# Altium schematic symbol library Electronic Devices_LIB.SchLib: 703 symbols (part 2 of 8) (continued)
## CRYSTAL_ABM3-16.000MHZ
designator Y?, comment Frequency: 16MHz  (hidden comment: ABM3-16.000MHZ-D2Y-T)
Crystal 16MHz ±20ppm (Tol) ±30ppm (Stability) 18pF FUND 40Ohm 2-Pin Mini-CSMD T/R; Manufacturer: Abracon; ESR (Equivalent Series Resistance): 40R; Manufacturer Part Number: ABM3-16.000MHZ-D2Y-T; RoHS: Yes; Category: Crystals; Stock 1: 95144; Pricing 1: 1=0.58000, 10=0.48600, 50=0.43720, 100=0.38850, 500=0.36912 (USD); Mount: Surface Mount; Case/Package: SMD/SMT; Number of Pins: 2; Min Operating Temperature: -40°C; Max Operating Temperature: 85°C; Packaging: Tape and Reel; Tolerance: 20ppm; Package Quantity: 1000; Frequency Tolerance: 20ppm; Load Capacitance: 18pF; Frequency Stability: 30ppm; Termination: SMD/SMT; Resistor Type: Ceramic; Series: ABM3; Series Resistance: 40R; Operating Frequency: 16 MHz; Length: 5mm; Width: 3.2mm; Height: 1.3mm; Lead Free: Lead Free; RoHS Compliant: Yes; ComponentLink1URL: https://datasheet.ciiva.com/855/abm3-855934.pdf?src-supplier=Digi-Key; ComponentLink1Description: https://datasheet.ciiva.com/855/abm3-855934.pdf?src-supplier=Digi-Key; ComponentLink2URL: https://datasheet.ciiva.com/855/abm3-855935.pdf?src-supplier=Digi-Key; ComponentLink2Description: https://datasheet.ciiva.com/855/abm3-855935.pdf?src-supplier=Digi-Key; ComponentLink3URL: https://datasheet.ciiva.com/855/abm3-855936.pdf?src-supplier=Digi-Key; ComponentLink3Description: https://datasheet.ciiva.com/855/abm3-855936.pdf?src-supplier=Digi-Key; ComponentLink4URL: https://datasheet.ciiva.com/4945/abm3-47699-4945397.pdf?src-supplier=Mouser; ComponentLink4Description: https://datasheet.ciiva.com/4945/abm3-47699-4945397.pdf?src-supplier=Mouser; ComponentLink5URL: https://datasheet.ciiva.com/7998/abm3-7998565.pdf?src-supplier=Element14; ComponentLink5Description: https://datasheet.ciiva.com/7998/abm3-7998565.pdf?src-supplier=Element14; ComponentLink6URL: https://datasheet.ciiva.com/28508/1754353-28508494.pdf?src-supplier=Element14; ComponentLink6Description: https://datasheet.ciiva.com/28508/1754353-28508494.pdf?src-supplier=Element14; ComponentLink7URL: https://datasheet.ciiva.com/16223/abm3-16223365.pdf?src-supplier=Future+Electronics; ComponentLink7Description: https://datasheet.ciiva.com/16223/abm3-16223365.pdf?src-supplier=Future+Electronics; Supplier 1: Digi-Key; Supplier 2: Newark; Supplier 3: Avnet; Supplier Part Number 1: 535-10638-1-ND; Supplier Part Number 2: 40Y1986; Supplier Part Number 3: 77R1470
footprint CRYSTAL_ABM3-16.000MHZ-D2Y-T
pins: 1 OSC1, 2 OSC2

## CRYSTAL_ABRACON_32.768KHZ
designator Y?, comment Frequency: 32.768KHz  (hidden comment: ASH7KW-32.768kHz-L-T)
OSC XO 32.768KHZ CMOS SMD; Manufacturer: Abracon; Supplier 1: Digi-Key; Manufacturer Part Number: ASH7KW-32.768kHz-L-T; RoHS: Yes; Category: Oscillators; Stock 1: 174; Pricing 1: 1=2.4, 10=2.343, 50=2.231, 100=1.9521, 500=1.89636 (USD); ComponentLink1URL: https://datasheet.ciiva.com/15010/ash7kw-15010563.pdf?src-supplier=Digi-Key; ComponentLink1Description: https://datasheet.ciiva.com/15010/ash7kw-15010563.pdf?src-supplier=Digi-Key; ComponentLink2URL: https://datasheet.ciiva.com/30037/ash7kw-30037881.pdf?src-supplier=Avnet; ComponentLink2Description: https://datasheet.ciiva.com/30037/ash7kw-30037881.pdf?src-supplier=Avnet; ComponentLink3URL: https://datasheet.ciiva.com/15010/ash7kw-15010565.pdf?src-supplier=Digi-Key; ComponentLink3Description: https://datasheet.ciiva.com/15010/ash7kw-15010565.pdf?src-supplier=Digi-Key; Supplier Part Number 1: 535-12059-1-ND
footprint CRYSTAL_32.768KHZ_ASH7KW32768kHzLT (0.126" L x 0.059" W (3.20mm x 1.50mm))
pins: 1 OUTPUT, 2 GND, 3 OE, 4 VDD

## CRYSTAL_ABRACON_32.768KHz_ABS07-32.768KHZ-T
designator Y?, comment Operating Frequency: 32.768 KHz  (hidden comment: ABS07-32.768KHZ-T)
Crystal 0.032768MHz ±20ppm (Tol) 12.5pF Flexural 70000Ohm 2-Pin CSMD T/R; Manufacturer: Abracon; ESR (Equivalent Series Resistance): 70kR; Supplier 1: Digikey; Manufacturer Part Number: ABS07-32.768KHZ-T; RoHS: Yes; Category: Crystals; Stock 1: 1583168; Pricing 1: 1=0.69, 10=0.576, 50=0.5184, 100=0.4607, 500=0.43768, 1000=0.36858 (USD); Case/Package: CSMD; Number of Pins: 2; Min Operating Temperature: -40°C; Max Operating Temperature: 85°C; Frequency Tolerance: 20ppm; Load Capacitance: 12.5pF; Frequency: 32.768kHz; Packaging: Tape and Reel; Series: ABS07; Package Quantity: 3000; Tolerance: 20ppm; Termination: SMD/SMT; Series Resistance: 70kR; Length: 3.2mm; Width: 1.5mm; Height: 0.9mm; Depth: 1.5mm; Radiation Hardening: No; RoHS Compliant: Yes; Lead Free: Lead Free; Reach SVHC Compliant: No; ComponentLink1URL: https://datasheet.ciiva.com/7998/1912628-7998667.pdf?src-supplier=Element14; ComponentLink1Description: https://datasheet.ciiva.com/7998/1912628-7998667.pdf?src-supplier=Element14; ComponentLink2URL: https://datasheet.ciiva.com/1357/1883680-1357319.pdf?src-supplier=Element14; ComponentLink2Description: https://datasheet.ciiva.com/1357/1883680-1357319.pdf?src-supplier=Element14; ComponentLink3URL: https://datasheet.ciiva.com/854/abs07-854936.pdf?src-supplier=Digikey; ComponentLink3Description: https://datasheet.ciiva.com/854/abs07-854936.pdf?src-supplier=Digikey; ComponentLink4URL: https://datasheet.ciiva.com/854/abs07-854935.pdf?src-supplier=Digikey; ComponentLink4Description: https://datasheet.ciiva.com/854/abs07-854935.pdf?src-supplier=Digikey; ComponentLink5URL: https://datasheet.ciiva.com/854/abs07-854937.pdf?src-supplier=Digikey; ComponentLink5Description: https://datasheet.ciiva.com/854/abs07-854937.pdf?src-supplier=Digikey; ComponentLink6URL: https://datasheet.ciiva.com/4944/abs07-11028-4944830.pdf?src-supplier=Mouser; ComponentLink6Description: https://datasheet.ciiva.com/4944/abs07-11028-4944830.pdf?src-supplier=Mouser; Supplier Part Number 1: 535-9542-1-ND
footprint CRYSTAL_ABS07-32.768KHZ-T (0.126" L x 0.059" W (3.20mm x 1.50mm))
pins: 1 OSC1, 2 OSC2

## CRYSTAL_ABRACON_50MHz_ASDMB-50.000MHZ-LC-T
designator Y?, comment ASDMB-50.000MHZ-LC-T
Oscillator MEMS 50MHz ±50ppm (Stability) 15pF LVCMOS 55% 1.8V/2.5V/3.3V Automotive 4-Pin QFN SMD T/R; Manufacturer: Abracon; Operating Supply Voltage: 3.3V; Max Supply Voltage: 4V; Min Supply Voltage: -300mV; Max Supply Current: 16mA; Supplier 1: Digikey; Manufacturer Part Number: ASDMB-50.000MHZ-LC-T; RoHS: Yes; Category: Oscillators; Stock 1: 1587; Pricing 1: 1=2.76, 10=2.134, 50=2.0774, 100=2.0507, 500=1.5675 (USD); Mount: Surface Mount; Case/Package: SMD/SMT; Number of Pins: 4; Min Operating Temperature: -40°C; Max Operating Temperature: 85°C; Frequency: 50MHz; Load Capacitance: 15pF; Packaging: Tape and Reel; Frequency Stability: 50ppm; Termination: SMD/SMT; Series: ASDMB, Pure Silicon™; Operating Frequency: 50 MHz; Reach SVHC Compliant: No; Lead Free: Lead Free; RoHS Compliant: Yes; ComponentLink1URL: https://datasheet.ciiva.com/871/asdmb-871369.pdf?src-supplier=Digikey; ComponentLink1Description: https://datasheet.ciiva.com/871/asdmb-871369.pdf?src-supplier=Digikey; ComponentLink2URL: https://datasheet.ciiva.com/871/asdmb-871370.pdf?src-supplier=Digikey; ComponentLink2Description: https://datasheet.ciiva.com/871/asdmb-871370.pdf?src-supplier=Digikey; ComponentLink3URL: https://datasheet.ciiva.com/871/asdmb-871371.pdf?src-supplier=Digikey; ComponentLink3Description: https://datasheet.ciiva.com/871/asdmb-871371.pdf?src-supplier=Digikey; ComponentLink4URL: https://datasheet.ciiva.com/48464/asdmb-48464511.pdf?src-supplier=Avnet; ComponentLink4Description: https://datasheet.ciiva.com/48464/asdmb-48464511.pdf?src-supplier=Avnet; Supplier Part Number 1: 535-11738-1-ND
footprint XTAL_ASDMB-50.000MHZ-LC-T
pins: 1 STANDBY, 2 GND (power), 3 OUTPUT, 4 VDD (power)

## CRYSTAL_ABS_32KHZ
designator Y?, comment Frequency: 32kHz  (hidden comment: ABS25-32.000KHZ-T)
Crystal 32.0000Khz 12.5Pf Smd/Tape & Reel (Tr) Rohs Compliant: Yes |Abracon ABS25-32.000KHZ-T; ESR (Equivalent Series Resistance): 50kR; Frequency Tolerance: 30ppm; Supplier 1: Digi-Key; Manufacturer: Abracon; Manufacturer Part Number: ABS25-32.000KHZ-T; RoHS: Yes; Category: Crystals; Stock 1: 595; Pricing 1: 1=1.84, 10=1.762, 50=1.721, 100=1.4751, 500=1.43414, 1000=1.20877 (USD); Mount: Surface Mount; Case/Package: SMD/SMT; Min Operating Temperature: -40°C; Max Operating Temperature: 85°C; Load Capacitance: 12.5pF; Packaging: Tape and Reel; Package Quantity: 3000; Series Resistance: 50kR; Tolerance: 30ppm; Termination: SMD/SMT; Series: ABS25; Length: 8mm; Width: 3.8mm; Height: 2.5mm; Depth: 3.8mm; RoHS Compliant: Yes; ComponentLink1URL: https://datasheet.ciiva.com/15116/getdatasheetpartid-723819-15116856.pdf?src-supplier=Verical; ComponentLink1Description: https://datasheet.ciiva.com/15116/getdatasheetpartid-723819-15116856.pdf?src-supplier=Verical; ComponentLink2URL: https://datasheet.ciiva.com/856/abs25-856061.pdf?src-supplier=Digi-Key; ComponentLink2Description: https://datasheet.ciiva.com/856/abs25-856061.pdf?src-supplier=Digi-Key; ComponentLink3URL: https://datasheet.ciiva.com/856/abs25-856062.pdf?src-supplier=Digi-Key; ComponentLink3Description: https://datasheet.ciiva.com/856/abs25-856062.pdf?src-supplier=Digi-Key; ComponentLink4URL: https://datasheet.ciiva.com/856/abs25-856063.pdf?src-supplier=Digi-Key; ComponentLink4Description: https://datasheet.ciiva.com/856/abs25-856063.pdf?src-supplier=Digi-Key; Supplier Part Number 1: 535-10242-1-ND
footprint CRYSTAL_ABS2532000KHZT (0.315" L x 0.150" W (8.00mm x 3.80mm))
pins: 1 XTAL_1, 2 GND_1, 3 GND_2, 4 XTAL_2

## CRYSTAL_DIODES_27MHZ_NX5427001Z
designator Y?, comment NX5427001Z  Frequency: 27MHz
Crystal Clock Oscillator 27MHz ±25ppm 3.3V 6-Pin SMD T/R; Manufacturer: Diodes; Supplier 1: Digi-Key; Manufacturer Part Number: NX5427001Z; RoHS: Yes; Category: Oscillators; Stock 1: 5550; Pricing 1: 1=4.2, 10=4, 50=3.7996, 100=3.3997 (USD); Supplier Part Number 1: NX5427001ZDICT-ND
footprint CRYSTAL_27MHz_NX5427001Z (0.197" L x 0.126" W (5.00mm x 3.20mm))
pins: 1 OE, 2 NC, 3 GROUND, 4 Q, 5 ~{Q}, 6 VCC

## CRYSTAL_ECS_24MHZ
designator Y?, comment Frequency: 24MHz  (hidden comment: ECS-240-18-23A-EN-TR)
Crystal 24MHz ±30ppm (Tol) ±50ppm (Stability) 18pF FUND 30Ohm 2-Pin Mini-SMD T/R; Manufacturer: ECS International; ESR (Equivalent Series Resistance): 40R; Manufacturer Part Number: ECS-240-18-23A-EN-TR; RoHS: Yes; Category: Crystals; Stock 1: 32996; Pricing 1: 1=1.14000, 10=1.08600, 50=1.06040, 100=0.90900, 500=0.88376 (USD); Mount: Surface Mount; Case/Package: SMD/SMT; Min Operating Temperature: -40°C; Max Operating Temperature: 85°C; Package Quantity: 1; Load Capacitance: 18pF; Packaging: Tape and Reel; Frequency Tolerance: 30ppm; Frequency Stability: 50ppm; Termination: SMD/SMT; Series: ECX-64A; Length: 0.236inch; Width: 0.138inch; Height: 0.043inch; ComponentLink1URL: https://datasheet.ciiva.com/860/ecx-64a-ecx-64cr-860829.pdf?src-supplier=Digi-Key; ComponentLink1Description: https://datasheet.ciiva.com/860/ecx-64a-ecx-64cr-860829.pdf?src-supplier=Digi-Key; ComponentLink2URL: https://datasheet.ciiva.com/860/ecx-64a-ecx-64cr-860830.pdf?src-supplier=Digi-Key; ComponentLink2Description: https://datasheet.ciiva.com/860/ecx-64a-ecx-64cr-860830.pdf?src-supplier=Digi-Key; ComponentLink3URL: https://datasheet.ciiva.com/860/ecx-64a-ecx-64cr-860831.pdf?src-supplier=Digi-Key; ComponentLink3Description: https://datasheet.ciiva.com/860/ecx-64a-ecx-64cr-860831.pdf?src-supplier=Digi-Key; Supplier 1: Digi-Key; Supplier 2: Mouser; Supplier 3: Avnet; Supplier Part Number 1: XC1669CT-ND; Supplier Part Number 2: 520-240-18-23A-EN; Supplier Part Number 3: ECS-240-18-23A-EN-TR
footprint CRYSTAL_ECS-240-18-23A-EN-TR
pins: 1 OSC1, 2 OSC2

## CRYSTAL_ECS_25MHZ_ECS-250-18-33-JTM-TR
designator Y?, comment ECS-250-18-33-JTM-TR  Frequency: 25MHz
Crystal 25MHz ±20ppm (Tol) ±20ppm (Stability) 18pF FUND 40Ohm 4-Pin Mini-CSMD T/R; Manufacturer: ECS International; Supplier 1: Digi-Key; Manufacturer Part Number: ECS-250-18-33-JTM-TR; RoHS: Yes; Stock 1: 49724; Pricing 1: 1=0.47, 10=0.39, 50=0.3512, 100=0.3122, 500=0.29654 (USD); ComponentLink1URL: http://www.ecsxtal.com/store/pdf/ecx-32.pdf?src-supplier=Digi-Key; ComponentLink1Description: http://www.ecsxtal.com/store/pdf/ecx-32.pdf?src-supplier=Digi-Key; ComponentLink2URL: https://ecsxtal.com/store/pdf/ecx-32.pdf?src-supplier=Digi-Key; ComponentLink2Description: https://ecsxtal.com/store/pdf/ecx-32.pdf?src-supplier=Digi-Key; ComponentLink3URL: https://datasheet.octopart.com/ECS-250-18-33-JTM-TR-ECS-International-datasheet-17018741.pdf?src-supplier=Electro+Sonic; ComponentLink3Description: https://datasheet.octopart.com/ECS-250-18-33-JTM-TR-ECS-International-datasheet-17018741.pdf?src-supplier=Electro+Sonic; Supplier Part Number 1: XC2964CT-ND
footprint CRYSTAL_ECS-250-18-33-JTM-TR (0.126" L x 0.098" W (3.20mm x 2.50mm))
pins: 1 IN, 2, 3 OUT, 4

## CRYSTAL_ECS_32.768KHZ_15PF
designator Y?, comment ECS-2012MV-327KE-TR
Oscillator XO 0.032768MHz -150ppm/10ppm 15pF CMOS 60% 3.3V 4-Pin Mini-CSMD; Manufacturer: ECS International; Supplier 1: Digi-Key; Manufacturer Part Number: ECS-2012MV-327KE-TR; RoHS: No; Category: Oscillators; Stock 1: 7895; Pricing 1: 1=2.54, 10=2.482, 50=2.3634, 100=2.068, 500=2.00888, 1000=1.71346 (USD); Supplier Part Number 1: 50-ECS-2012MV-327KE-TRCT-ND

## CRYSTAL_ECS_48MHz_ECS-2018-480-BN
designator Y?, comment ECS-2018-480-BN  Frequency: 48MHz
Oscillator XO 48MHz ±50ppm 15pF HCMOS 55% 1.8V 4-Pin SMD T/R; Manufacturer: ECS International; Max Supply Current: 3.5mA; Supplier 1: Digikey; Manufacturer Part Number: ECS-2018-480-BN; RoHS: Yes; Category: Oscillators; Stock 1: 1899; Pricing 1: 1=4.35, 10=3.75, 50=3.3842, 100=3.2385, 500=2.92546, 1000=2.80065, 2000=2.68148, 3000=2.61427 (USD); Mount: Surface Mount; Case/Package: SMD/SMT; Min Operating Temperature: -40°C; Max Operating Temperature: 85°C; Packaging: Cut Tape; Frequency Stability: 50ppm; Series: ECS-2018; RoHS Compliant: Yes; ComponentLink1URL: https://datasheet.ciiva.com/865/ecs-2018-865487.pdf?src-supplier=Digikey; ComponentLink1Description: https://datasheet.ciiva.com/865/ecs-2018-865487.pdf?src-supplier=Digikey; ComponentLink2URL: https://datasheet.ciiva.com/865/ecs-2018-865488.pdf?src-supplier=Digikey; ComponentLink2Description: https://datasheet.ciiva.com/865/ecs-2018-865488.pdf?src-supplier=Digikey; ComponentLink3URL: https://datasheet.ciiva.com/865/ecs-2018-865489.pdf?src-supplier=Digikey; ComponentLink3Description: https://datasheet.ciiva.com/865/ecs-2018-865489.pdf?src-supplier=Digikey; Supplier Part Number 1: XC1415CT-ND
footprint CRYSTAL_OSC_ECS-2018-480-BN
pins: 1 TRI_STATE, 2 GND (power), 3 OUT, 4 VDD

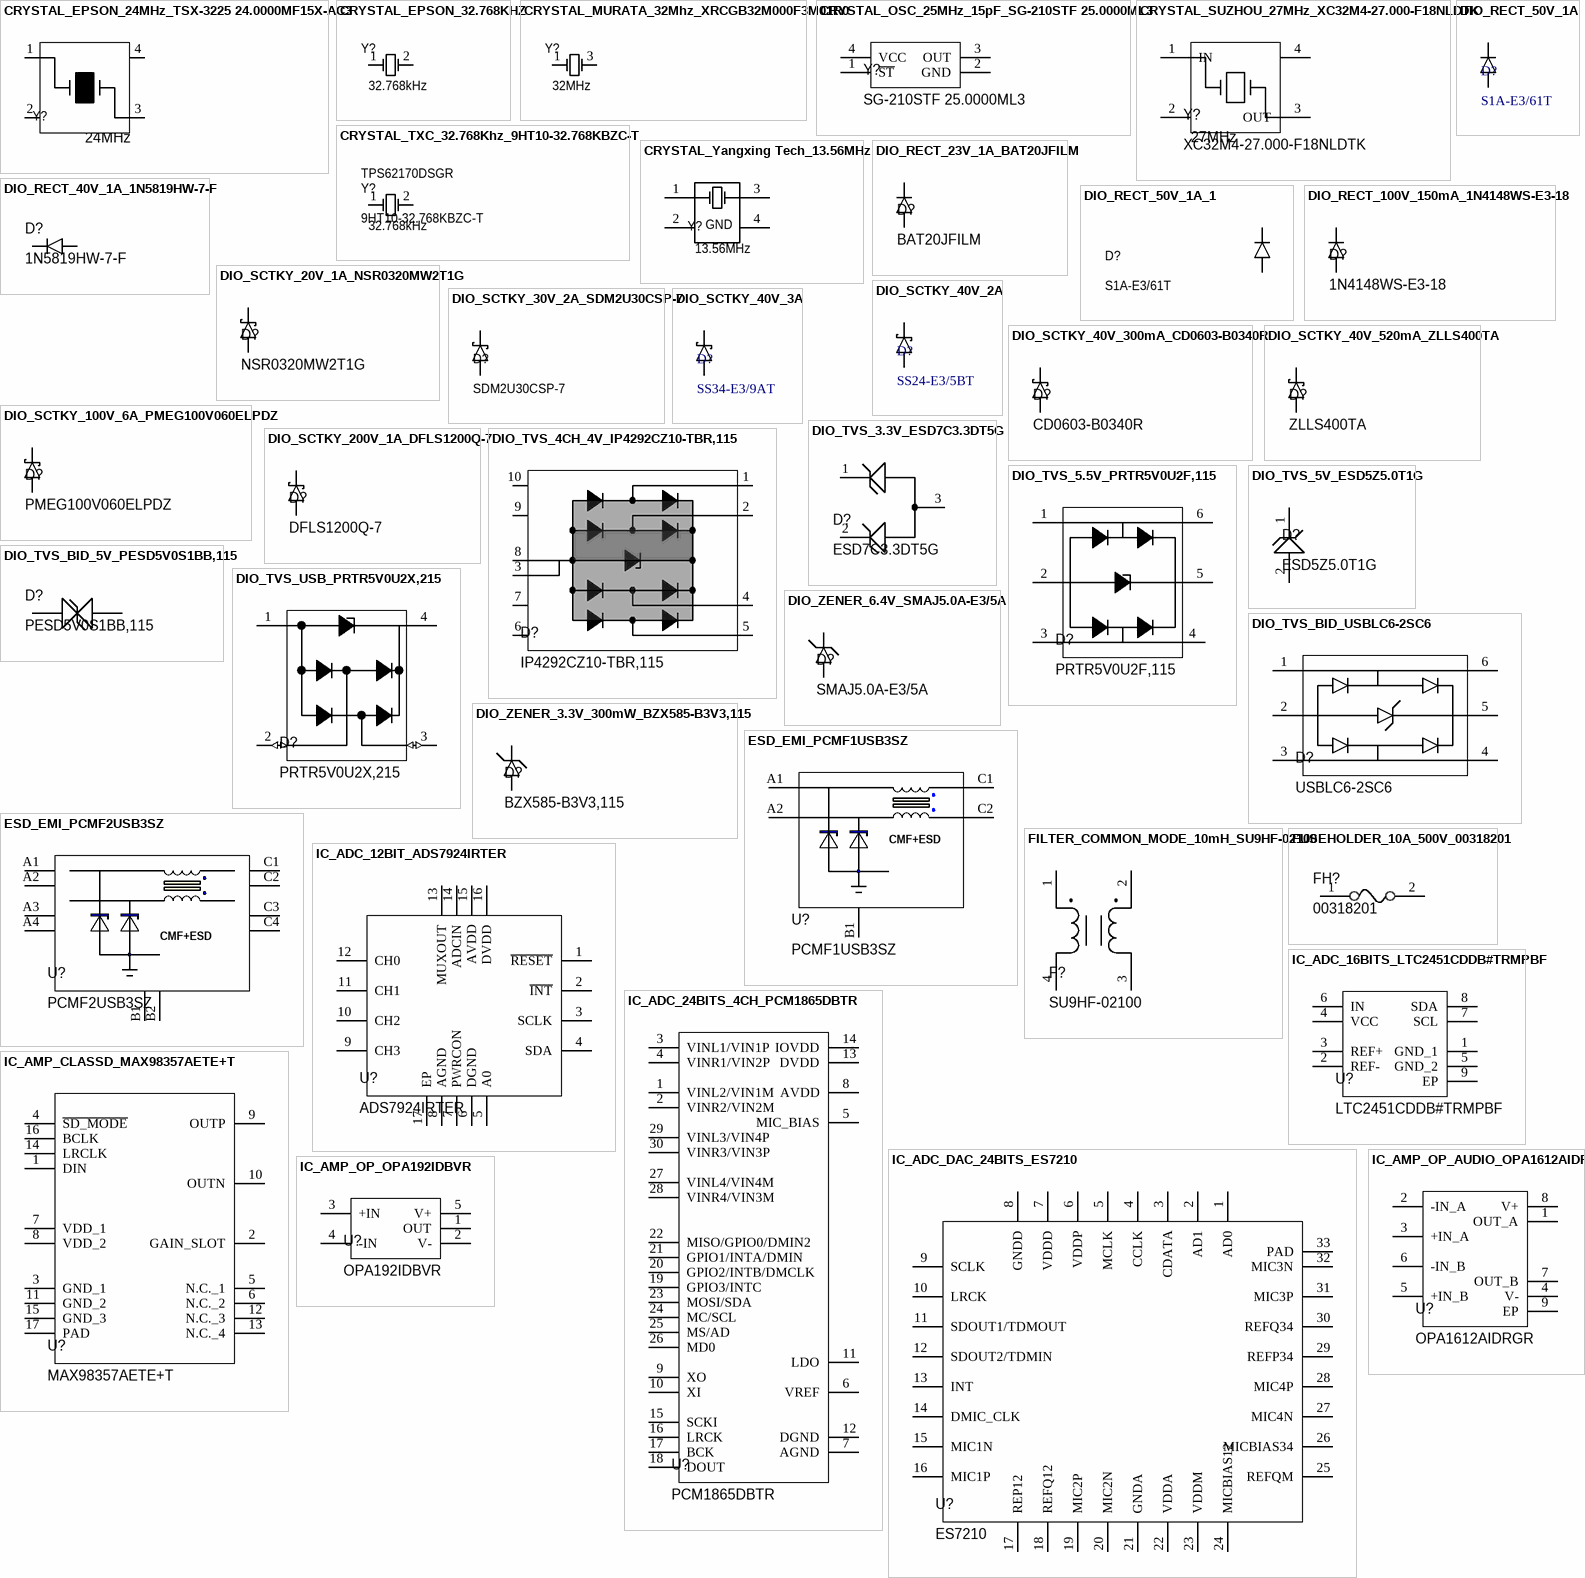
[diagram p6: symbols CRYSTAL_EPSON_24MHz_TSX-3225 24.0000MF15X-AC3 to IC_AMP_OP_OPA192IDBVR]

## CRYSTAL_EPSON_24MHz_TSX-3225 24.0000MF15X-AC3
designator Y?, comment Frequency: 24MHz  (hidden comment: TSX-3225 24.0000MF15X-AC3)
24 MHz ±10ppm Crystal 9pF 40 Ohms 4-SMD, No Lead; Manufacturer: Epson; Supplier 1: Digi-Key; Manufacturer Part Number: TSX-3225 24.0000MF15X-AC3; RoHS: Yes; Category: Crystals; Mount: Surface Mount; Case/Package: SMD/SMT; Min Operating Temperature: -40°C; Max Operating Temperature: 85°C; Load Capacitance: 9pF; Frequency Tolerance: 10ppm; Series: FC-135; RoHS Compliant: Yes
footprint CRYSTAL_24MHz_OSCCC320X250X60 (0.126" L x 0.098" W (3.20mm x 2.50mm))
pins: 1, 2, 3, 4

## CRYSTAL_EPSON_32.768KHZ
designator Y?, comment Frequency: 32.768kHz  (hidden comment: FC-135 32.7680KA-AG5)
Crystal 0.032768MHz ±20ppm (Tol) 7pF FUND 70000Ohm 2-Pin SMD T/R; Manufacturer: Epson; ESR (Equivalent Series Resistance): 70kR; Supplier 1: Digi-Key; Manufacturer Part Number: FC-135 32.7680KA-AG5; RoHS: Yes; Category: Crystals; Stock 1: 220593; Pricing 1: 1=0.61, 10=0.505, 50=0.4544, 100=0.404, 500=0.3838, 1000=0.3232 (USD); Mount: Surface Mount; Case/Package: SMD/SMT; Min Operating Temperature: -40°C; Max Operating Temperature: 85°C; Packaging: Tape and Reel; Load Capacitance: 7pF; Frequency Tolerance: 20ppm; Series: FC-135; Length: 0.126inch; Width: 0.061inch; Height: 0.035inch; RoHS Compliant: Yes; ComponentLink1URL: https://support.epson.biz/td/api/doc_check.php?dl=brief_FC-135&amp;lang=en&src-supplier=Digi-Key; ComponentLink1Description: https://support.epson.biz/td/api/doc_check.php?dl=brief_FC-135&amp;lang=en&src-supplier=Digi-Key; ComponentLink2URL: https://support.epson.biz/td/api/doc_check.php?dl=brief_FC-135R_en.pdf&src-supplier=Digi-Key; ComponentLink2Description: https://support.epson.biz/td/api/doc_check.php?dl=brief_FC-135R_en.pdf&src-supplier=Digi-Key; ComponentLink3URL: https://datasheet.octopart.com/FC-135-32.7680KA-AG5-Epson-datasheet-140567380.pdf?src-supplier=Arrow.cn; ComponentLink3Description: https://datasheet.octopart.com/FC-135-32.7680KA-AG5-Epson-datasheet-140567380.pdf?src-supplier=Arrow.cn; Supplier Part Number 1: SER4271CT-ND
footprint CRYSTAL_FC135327680KAAG5 (2-SMD, No Lead 0.126" L x 0.059" W (3.20mm x 1.50mm))
pins: 1 OSC1, 2 OSC2

## CRYSTAL_MURATA_32Mhz_XRCGB32M000F3M01R0
designator Y?, comment Frequency: 32MHz  (hidden comment: XRCGB32M000F3M01R0)
Cap Chip Type Crystal Resonator By Liquid Tight Package For Mhz Band; Manufacturer: Murata; Supplier 1: Digi-Key; Manufacturer Part Number: XRCGB32M000F3M01R0; RoHS: Yes; Category: Crystals; Stock 1: 2554; Pricing 1: 1=0.31, 10=0.256, 50=0.2306, 100=0.205, 500=0.19478, 1000=0.16402 (USD); RoHS Compliant: Yes; Supplier Part Number 1: 490-XRCGB32M000F3M01R0CT-ND
footprint CRYSTAL_XRCGB32M000F3M01R0 (0.079" L x 0.063" W (2.00mm x 1.60mm))
pins: 1 OSC1, 3 OSC2

## CRYSTAL_OSC_25MHz_15pF_SG-210STF 25.0000ML3
designator Y?, comment SG-210STF 25.0000ML3
Oscillator XO 25MHz ±50ppm 15pF CMOS 55% 1.8V/2.5V/3.3V Medical 4-Pin SMD T/R; Manufacturer: Epson; Max Supply Current: 2.2mA; Min Supply Voltage: 1.6V; Max Supply Voltage: 3.6V; Supplier 1: Digikey; Manufacturer Part Number: SG-210STF 25.0000ML3; RoHS: Yes; Category: Oscillators; Stock 1: 22617; Pricing 1: 1=1.62, 10=1.58, 50=1.5052, 100=1.325 (USD); Mount: Surface Mount; Case/Package: SMD/SMT; Min Operating Temperature: -40°C; Max Operating Temperature: 85°C; Frequency: 25MHz; Frequency Stability: 50ppm; Load Capacitance: 15pF; Package Quantity: 250; Packaging: Tape and Reel; Termination: SMD/SMT; Current Rating: 2.2mA; Max Duty Cycle: 55%; Series: SG-210STF; Length: 0.098inch; Width: 2mm; Height: 0.035inch; RoHS Compliant: Yes; Lead Free: Lead Free; ComponentLink1URL: https://datasheet.ciiva.com/29629/029-sg-210stf-e147-29629803.pdf?src-supplier=Digikey; ComponentLink1Description: https://datasheet.ciiva.com/29629/029-sg-210stf-e147-29629803.pdf?src-supplier=Digikey; ComponentLink2URL: https://datasheet.ciiva.com/29629/029-sg-210stf-e147-29629804.pdf?src-supplier=Digikey; ComponentLink2Description: https://datasheet.ciiva.com/29629/029-sg-210stf-e147-29629804.pdf?src-supplier=Digikey; ComponentLink3URL: https://datasheet.ciiva.com/29629/029-sg-210stf-e147-29629805.pdf?src-supplier=Digikey; ComponentLink3Description: https://datasheet.ciiva.com/29629/029-sg-210stf-e147-29629805.pdf?src-supplier=Digikey; Supplier Part Number 1: SER3807CT-ND
footprint CRYSTAL_25MHz_SG210STF250000ML3
pins: 1 ~{ST}, 2 GND, 3 OUT, 4 VCC

## CRYSTAL_SUZHOU_27MHz_XC32M4-27.000-F18NLDTK
designator Y?, comment XC32M4-27.000-F18NLDTK  Frequency: 27MHz
27 MHz ±20ppm Crystal 18pF 40 Ohms 4-SMD, No Lead; Manufacturer: Suzhou Hangjing Elec&Tech Co.,Ltd; Supplier 1: Digi-Key; Manufacturer Part Number: XC32M4-27.000-F18NLDTK; RoHS: Yes; Supplier Part Number 1: 4309-XC32M4-27.000-F18NLDTKCS-ND
footprint CRYSTAL_ECS-250-18-33-JTM-TR (0.126" L x 0.098" W (3.20mm x 2.50mm))
pins: 1 IN, 2, 3 OUT, 4

## CRYSTAL_TXC_32.768Khz_9HT10-32.768KBZC-T
designator Y?, comment 9HT10-32.768KBZC-T  Frequency: 32.768kHz  Supplier Part Number 2: TPS62170DSGR
Buck Switching Regulator IC Positive Adjustable 0.9V 1 Output 500mA 8-WFDFN Exposed Pad; Manufacturer: TXC; Load Capacitance: 9pF; ESR (Equivalent Series Resistance): 70kR; Frequency Tolerance: 50ppm; Output Voltage: 6V; Number of Outputs: 1; Max Input Voltage: 17V; Min Input Voltage: 3V; Switching Frequency: 2.25MHz; Min Output Voltage: 900mV; Synchronous Rectifier: Yes; Quiescent Current: 17uA; Supplier 1: Digi-Key; Manufacturer Part Number: 9HT10-32.768KBZC-T; RoHS: Yes; Category: Crystals; Stock 1: 13432; Pricing 1: 1=0.72, 10=0.634, 50=0.5924, 100=0.5235, 500=0.49596, 1000=0.41331 (USD); Mount: Surface Mount; Case/Package: SMD/SMT; Min Operating Temperature: -40°C; Max Operating Temperature: 85°C; Packaging: Tape and Reel; Length: 0.126inch; Width: 0.061inch; Height: 0.033inch; ComponentLink1URL: http://www.mouser.com/ds/2/417/9ht10-8208.pdf?src-supplier=Mouser; ComponentLink1Description: http://www.mouser.com/ds/2/417/9ht10-8208.pdf?src-supplier=Mouser; ComponentLink2URL: http://www.txccrystal.com/images/pdf/number-crystal-khz.pdf?src-supplier=Digi-Key; ComponentLink2Description: http://www.txccrystal.com/images/pdf/number-crystal-khz.pdf?src-supplier=Digi-Key; ComponentLink3URL: http://www.txccrystal.com/images/pdf/9ht10.pdf?src-supplier=Digi-Key; ComponentLink3Description: http://www.txccrystal.com/images/pdf/9ht10.pdf?src-supplier=Digi-Key; Supplier Part Number 1: 887-2604-1-ND; Supplier 2: Texas Instruments; Stock 2: 180323; Pricing 2: 1=0.896, 100=0.74, 250=0.532, 1000=0.4 (USD); Number of Pins: 8; Output Current: 500mA; Package Quantity: 3000; Max Output Current: 500mA; Max Output Voltage: 6V; Operating Supply Voltage: 17V; Output Type: Adjustable; Output Configuration: Positive; Series: DCS-Control™; Reach SVHC Compliant: No; Lead Free: Lead Free; RoHS Compliant: Yes; ComponentLink4URL: https://datasheet.ciiva.com/4880/slvsat8a-121157-4880709.pdf?src-supplier=Mouser; ComponentLink4Description: https://datasheet.ciiva.com/4880/slvsat8a-121157-4880709.pdf?src-supplier=Mouser; ComponentLink5URL: https://datasheet.ciiva.com/2034/tps62170-2034445.pdf?src-supplier=Digikey; ComponentLink5Description: https://datasheet.ciiva.com/2034/tps62170-2034445.pdf?src-supplier=Digikey; ComponentLink6URL: https://datasheet.ciiva.com/2034/tps62170-2034446.pdf?src-supplier=Digikey; ComponentLink6Description: https://datasheet.ciiva.com/2034/tps62170-2034446.pdf?src-supplier=Digikey; ComponentLink7URL: https://datasheet.ciiva.com/2034/tps62170-2034447.pdf?src-supplier=Digikey; ComponentLink7Description: https://datasheet.ciiva.com/2034/tps62170-2034447.pdf?src-supplier=Digikey; ComponentLink8URL: https://datasheet.ciiva.com/14377/tps62170-14377887.pdf?src-supplier=Avnet; ComponentLink8Description: https://datasheet.ciiva.com/14377/tps62170-14377887.pdf?src-supplier=Avnet
footprint CRYSTAL_9HT10-32.768KBZC-T (0.126" L x 0.059" W (3.20mm x 1.50mm))
pins: 1 OSC1, 2 OSC2

## CRYSTAL_Yangxing Tech_13.56MHz
designator Y?, comment Frequency: 13.56MHz  (hidden comment: X32251356MSB4SI)
13.56MHz 20pF ±10ppm SMD3225-4P Crystals ROHS; Manufacturer part number: X32251356MSB4S1; Manufacturer: Yangxing tech; Supplier: LCSC; Load Capacitance: 20pF; ComponentLink1Description: Supplier; ComponentLink1URL: https://www.lcsc.com/product-detail/span-style-background-color-ff0-Crystals-span_Yangxing-Tech-X32251356MSB4SI_C21662.html; ComponentLink2Description: Datasheet; ComponentLink2URL: https://datasheet.lcsc.com/lcsc/2304140030_Yangxing-Tech-X32251356MSB4SI_C21662.pdf
footprint CRYSTAL_X32251356MSB4SI (Dimensions:3.20 x 2.50 x 0.70 mm)
pins: 1 OSC1, 2 OSC2, 3, 4 OSC2

## DIO_RECT_23V_1A_BAT20JFILM
designator D?, comment BAT20JFILM
VR=23V  IF=1A 30pF; Manufacturer: STMicroelectronics; Forward Current: 1A; Max Reverse Current: 12uA; Max Repetitive Reverse Voltage (Vrrm): 23V; Peak Non-Repetitive Surge Current: 5A; Forward Voltage: 620mV; Polarity: Standard; Supplier 1: Digi-Key; Manufacturer Part Number: BAT20JFILM; RoHS: Yes; Category: Rectifier Diodes; Stock 1: 44534; Pricing 1: 1=0.42, 10=0.31, 100=0.1753, 500=0.11608, 1000=0.08899 (USD); Mount: Surface Mount; Number of Pins: 2; Min Operating Temperature: -65°C; Max Operating Temperature: 150°C; Package Quantity: 3000; Packaging: Tape and Reel; Max Surge Current: 5A; Average Rectified Current: 1A; Max Reverse Leakage Current: 12uA; Max Forward Surge Current (Ifsm): 5A; Voltage Rating (DC): 23V; Capacitance: 30pF; Output Current: 1A; Current Rating: 1A; Max Reverse Voltage (DC): 23V; Series: -; Length: 1.8mm; Width: 1.35mm; Height: 1.03mm; Radiation Hardening: No; Reach SVHC Compliant: No; Lead Free: Lead Free; RoHS Compliant: Yes; ComponentLink1URL: https://datasheet.ciiva.com/16984/0900766b80ec7fd9-16984585.pdf?src-supplier=Allied+Electronics; ComponentLink1Description: https://datasheet.ciiva.com/16984/0900766b80ec7fd9-16984585.pdf?src-supplier=Allied+Electronics; ComponentLink2URL: https://datasheet.ciiva.com/23916/1700331-23916544.pdf?src-supplier=Newark; ComponentLink2Description: https://datasheet.ciiva.com/23916/1700331-23916544.pdf?src-supplier=Newark; ComponentLink3URL: https://datasheet.ciiva.com/915/cd00012201-915680.pdf?src-supplier=Digi-Key; ComponentLink3Description: https://datasheet.ciiva.com/915/cd00012201-915680.pdf?src-supplier=Digi-Key; ComponentLink4URL: https://datasheet.ciiva.com/915/cd00012201-915681.pdf?src-supplier=Digi-Key; ComponentLink4Description: https://datasheet.ciiva.com/915/cd00012201-915681.pdf?src-supplier=Digi-Key; ComponentLink5URL: https://datasheet.ciiva.com/915/cd00012201-915682.pdf?src-supplier=Digi-Key; ComponentLink5Description: https://datasheet.ciiva.com/915/cd00012201-915682.pdf?src-supplier=Digi-Key; Supplier Part Number 1: 497-3381-1-ND
footprint DIO_SOD2512X113N (SOD-323)
pins: 1 K, 2 A

## DIO_RECT_40V_1A_1N5819HW-7-F
designator D?, comment 1N5819HW-7-F
Rectifier Diode, Schottky, 1 Phase, 1 Element, 1A, 40V V(RRM), Silicon; Manufacturer: Diodes; Max Reverse Current: 50uA; Max Forward Surge Current (Ifsm): 25A; Forward Voltage: 450mV; Max Power Dissipation: 450mW; Polarity: Standard; Capacitance: 50pF; Supplier 1: Digikey; Manufacturer Part Number: 1N5819HW-7-F; RoHS: Yes; Category: Rectifier Diodes; Stock 1: 221439; Pricing 1: 1=0.41, 10=0.289, 100=0.146, 500=0.11908, 1000=0.08836 (USD); Case/Package: SOD-123-2; Number of Pins: 2; Weight: 0.000353oz; Min Operating Temperature: -65°C; Max Operating Temperature: 125°C; Forward Current: 1A; Max Repetitive Reverse Voltage (Vrrm): 40V; Packaging: Tape and Reel; Peak Non-Repetitive Surge Current: 25A; Package Quantity: 3000; Average Rectified Current: 1A; Termination: SMD/SMT; Voltage Rating (DC): 40V; Current Rating: 1A; Output Current: 1A; Max Reverse Voltage (DC): 40V; Series: -; Reverse Voltage: 40V; Length: 2.85mm; Width: 1.7mm; Height: 1.25mm; Radiation Hardening: No; RoHS Compliant: Yes; Reach SVHC Compliant: No; Lead Free: Lead Free; ComponentLink1URL: https://datasheet.ciiva.com/16303/ds30217-16303296.pdf?src-supplier=Future+Electronics; ComponentLink1Description: https://datasheet.ciiva.com/16303/ds30217-16303296.pdf?src-supplier=Future+Electronics; ComponentLink2URL: https://datasheet.ciiva.com/27092/1538419-27092484.pdf?src-supplier=Jameco; ComponentLink2Description: https://datasheet.ciiva.com/27092/1538419-27092484.pdf?src-supplier=Jameco; ComponentLink3URL: https://datasheet.ciiva.com/912/ds30217-912801.pdf?src-supplier=Digikey; ComponentLink3Description: https://datasheet.ciiva.com/912/ds30217-912801.pdf?src-supplier=Digikey; ComponentLink4URL: https://datasheet.ciiva.com/912/ds30217-912802.pdf?src-supplier=Digikey; ComponentLink4Description: https://datasheet.ciiva.com/912/ds30217-912802.pdf?src-supplier=Digikey; ComponentLink5URL: https://datasheet.ciiva.com/912/ds30217-912803.pdf?src-supplier=Digikey; ComponentLink5Description: https://datasheet.ciiva.com/912/ds30217-912803.pdf?src-supplier=Digikey; ComponentLink6URL: https://datasheet.ciiva.com/8303/ds30217-8303132.pdf?src-supplier=Avnet; ComponentLink6Description: https://datasheet.ciiva.com/8303/ds30217-8303132.pdf?src-supplier=Avnet; ComponentLink7URL: https://datasheet.ciiva.com/1177/ds30217-1177089.pdf?src-supplier=Element14; ComponentLink7Description: https://datasheet.ciiva.com/1177/ds30217-1177089.pdf?src-supplier=Element14; Supplier Part Number 1: 1N5819HW-FDIDKR-ND
footprint DIO_SOD3716X145N
pins: 1 K, 2 A

## DIO_RECT_50V_1A
designator D?, comment S1A-E3/61T
Diode Standard Recovery Rectifier 50V 1A 2-Pin SMA T/R; Manufacturer: Vishay Semiconductors; Max Surge Current: 40A; Max Reverse Current: 1uA; Recovery Time: 1800ns; Forward Voltage: 1.1V; Reverse Recovery Time: 1.8us; Element Configuration: Single; Capacitance: 12pF; Manufacturer Part Number: S1A-E3/61T; RoHS: Yes; Category: Rectifier Diodes; Stock 1: 235800; Pricing 1: 1800=0.07352, 3600=0.06631, 5400=0.05766, 12600=0.04901, 45000=0.04613, 90000=0.04488 (USD); Mount: Surface Mount; Case/Package: SMA; Number of Pins: 2; Contact Plating: Tin,Matte; Min Operating Temperature: -55°C; Max Operating Temperature: 150°C; Packaging: Tape and Reel; Forward Current: 1A; Package Quantity: 1800; Average Rectified Current: 1A; Peak Non-Repetitive Surge Current: 40A; Max Repetitive Reverse Voltage (Vrrm): 50V; Max Reverse Voltage (DC): 50V; Max Forward Surge Current (Ifsm): 40A; Polarity: Standard; Voltage Rating (DC): 50V; Current Rating: 1A; Output Current: 1A; Reverse Voltage: 50V; Series: -; Length: 4.5mm; Width: 2.79mm; Height: 2.29mm; Radiation Hardening: No; RoHS Compliant: Yes; Lead Free: Lead Free; ComponentLink1URL: https://datasheet.ciiva.com/15144/getdatasheetpartid-91628-15144691.pdf?src-supplier=Verical; ComponentLink1Description: https://datasheet.ciiva.com/15144/getdatasheetpartid-91628-15144691.pdf?src-supplier=Verical; ComponentLink2URL: https://datasheet.ciiva.com/910/s1-910534.pdf?src-supplier=Digi-Key; ComponentLink2Description: https://datasheet.ciiva.com/910/s1-910534.pdf?src-supplier=Digi-Key; ComponentLink3URL: https://datasheet.ciiva.com/910/s1-910535.pdf?src-supplier=Digi-Key; ComponentLink3Description: https://datasheet.ciiva.com/910/s1-910535.pdf?src-supplier=Digi-Key; ComponentLink4URL: https://datasheet.ciiva.com/910/s1-910536.pdf?src-supplier=Digi-Key; ComponentLink4Description: https://datasheet.ciiva.com/910/s1-910536.pdf?src-supplier=Digi-Key; ComponentLink5URL: https://datasheet.ciiva.com/4452/s1-101424-4452490.pdf?src-supplier=Mouser; ComponentLink5Description: https://datasheet.ciiva.com/4452/s1-101424-4452490.pdf?src-supplier=Mouser; ComponentLink6URL: https://datasheet.ciiva.com/8287/s1-8287144.pdf?src-supplier=Avnet; ComponentLink6Description: https://datasheet.ciiva.com/8287/s1-8287144.pdf?src-supplier=Avnet; ComponentLink7URL: https://datasheet.ciiva.com/8287/s1-8287146.pdf?src-supplier=Avnet; ComponentLink7Description: https://datasheet.ciiva.com/8287/s1-8287146.pdf?src-supplier=Avnet; ComponentLink8URL: https://datasheet.ciiva.com/16199/s1-16199963.pdf?src-supplier=Future+Electronics; ComponentLink8Description: https://datasheet.ciiva.com/16199/s1-16199963.pdf?src-supplier=Future+Electronics; Supplier 1: Digi-Key; Supplier 2: Arrow Electronics; Supplier 3: TTI; Supplier Part Number 1: S1A-E3/61TGITR-ND; Supplier Part Number 2: S1A-E3/61T; Supplier Part Number 3: S1A-E3/61T
footprint DIO_Vishay_95400_0 (DO-214AC (SMA))
pins: 1 K, 2 A

## DIO_RECT_50V_1A_1
designator D?, comment S1A-E3/61T
Diode Standard Recovery Rectifier 50V 1A 2-Pin SMA T/R; Manufacturer: Vishay Semiconductors; Max Surge Current: 40A; Max Reverse Current: 1uA; Recovery Time: 1800ns; Reverse Recovery Time: 1.8us; Forward Voltage: 1.1V; Capacitance: 12pF; Supplier 1: Digi-Key; Manufacturer Part Number: S1A-E3/61T; RoHS: Yes; Category: Rectifier Diodes; Stock 1: 154540; Pricing 1: 1=0.37, 10=0.301, 100=0.1597, 500=0.10506 (USD); Mount: Surface Mount; Case/Package: SMA; Number of Pins: 2; Min Operating Temperature: -55°C; Max Operating Temperature: 150°C; Packaging: Tape and Reel; Forward Current: 1A; Package Quantity: 1800; Average Rectified Current: 1A; Peak Non-Repetitive Surge Current: 40A; Max Repetitive Reverse Voltage (Vrrm): 50V; Max Reverse Voltage (DC): 50V; Max Forward Surge Current (Ifsm): 40A; Polarity: Standard; Voltage Rating (DC): 50V; Current Rating: 1A; Output Current: 1A; Reverse Voltage: 50V; Series: -; Length: 4.5mm; Width: 2.79mm; Height: 2.29mm; Radiation Hardening: No; RoHS Compliant: Yes; Lead Free: Lead Free; Reach SVHC Compliant: Unknown; ComponentLink1URL: https://datasheet.ciiva.com/8287/s1-8287144.pdf?src-supplier=Avnet; ComponentLink1Description: https://datasheet.ciiva.com/8287/s1-8287144.pdf?src-supplier=Avnet; ComponentLink2URL: https://datasheet.ciiva.com/8287/s1-8287146.pdf?src-supplier=Avnet; ComponentLink2Description: https://datasheet.ciiva.com/8287/s1-8287146.pdf?src-supplier=Avnet; ComponentLink3URL: https://datasheet.ciiva.com/910/s1-910534.pdf?src-supplier=Digi-Key; ComponentLink3Description: https://datasheet.ciiva.com/910/s1-910534.pdf?src-supplier=Digi-Key; ComponentLink4URL: https://datasheet.ciiva.com/910/s1-910535.pdf?src-supplier=Digi-Key; ComponentLink4Description: https://datasheet.ciiva.com/910/s1-910535.pdf?src-supplier=Digi-Key; ComponentLink5URL: https://datasheet.ciiva.com/910/s1-910536.pdf?src-supplier=Digi-Key; ComponentLink5Description: https://datasheet.ciiva.com/910/s1-910536.pdf?src-supplier=Digi-Key; ComponentLink6URL: https://datasheet.ciiva.com/4452/s1-101424-4452490.pdf?src-supplier=Mouser; ComponentLink6Description: https://datasheet.ciiva.com/4452/s1-101424-4452490.pdf?src-supplier=Mouser; Supplier Part Number 1: S1A-E3/61TGICT-ND
footprint DIO_DIOM5226X230N (DO-214AC, SMA)
pins: 1 K, 2 A

## DIO_RECT_100V_150mA_1N4148WS-E3-18
designator D?, comment 1N4148WS-E3-18
Rectifier Diode Small Signal Switching Si 100V 0.15A 4ns 2-Pin SOD-323 T/R; Manufacturer: Vishay Semiconductors; Max Surge Current: 350mA; Forward Voltage: 1.2V; Forward Current: 150mA; Max Power Dissipation: 200mW; Max Reverse Leakage Current: 100uA; Max Reverse Voltage (DC): 75V; Supplier 1: Digi-Key; Manufacturer Part Number: 1N4148WS-E3-18; RoHS: Yes; Category: Rectifier Diodes; Stock 1: 23792; Pricing 1: 1=0.23, 10=0.155, 100=0.0755, 500=0.06302, 1000=0.04378, 2000=0.03795, 5000=0.0352 (USD); Mount: Surface Mount; Number of Pins: 2; Weight: 0.000152oz; Contact Plating: Tin; Min Operating Temperature: -55°C; Max Operating Temperature: 150°C; Packaging: Tape and Reel; Recovery Time: 4ns; Package Quantity: 10000; Average Rectified Current: 150mA; Reverse Recovery Time: 4ns; Peak Non-Repetitive Surge Current: 350mA; Max Repetitive Reverse Voltage (Vrrm): 100V; Max Forward Surge Current (Ifsm): 350mA; Series: -; Radiation Hardening: No; RoHS Compliant: Yes; Reach SVHC Compliant: Unknown; ComponentLink1URL: https://datasheet.ciiva.com/29885/1n4148ws-29885947.pdf?src-supplier=Avnet; ComponentLink1Description: https://datasheet.ciiva.com/29885/1n4148ws-29885947.pdf?src-supplier=Avnet; Supplier Part Number 1: 1N4148WS-E3-18GICT-ND
footprint DIO_SOD2713X115N (SOD-323)
pins: 1 K, 2 A

## DIO_SCTKY_20V_1A_NSR0320MW2T1G
designator D?, comment NSR0320MW2T1G
VR=20V IF=1A 29pF P=200mW; Manufacturer: ON Semiconductor; Forward Current: 1A; Max Reverse Current: 50uA; Forward Voltage: 500mV; Max Repetitive Reverse Voltage (Vrrm): 23V; Max Forward Surge Current (Ifsm): 5A; Power Dissipation: 200mW; Element Configuration: Single; Max Reverse Voltage (DC): 20V; Supplier 1: Digikey; Manufacturer Part Number: NSR0320MW2T1G; RoHS: Yes; Category: Schottky Diodes; Stock 1: 158845; Pricing 1: 1=0.32, 10=0.223, 100=0.1089, 500=0.09082, 1000=0.0631 (USD); Case/Package: SOD-323-2; Number of Pins: 2; Min Operating Temperature: -55°C; Max Operating Temperature: 125°C; Package Quantity: 1; Packaging: Tape and Reel; Average Rectified Current: 1A; Max Reverse Leakage Current: 50uA; Series: -; Length: 1.8mm; Width: 1.35mm; Height: 0.9mm; Radiation Hardening: No; Reach SVHC Compliant: No; Lead Free: Lead Free; RoHS Compliant: Yes; ComponentLink1URL: https://datasheet.ciiva.com/915/nsr0320mw2t1-d-915506.pdf?src-supplier=Avnet; ComponentLink1Description: https://datasheet.ciiva.com/915/nsr0320mw2t1-d-915506.pdf?src-supplier=Avnet; ComponentLink2URL: https://datasheet.ciiva.com/22659/1708337-22659115.pdf?src-supplier=Element14; ComponentLink2Description: https://datasheet.ciiva.com/22659/1708337-22659115.pdf?src-supplier=Element14; ComponentLink3URL: https://datasheet.ciiva.com/16210/nsr0320mw2t1-d-16210139.pdf?src-supplier=Future+Electronics; ComponentLink3Description: https://datasheet.ciiva.com/16210/nsr0320mw2t1-d-16210139.pdf?src-supplier=Future+Electronics; Supplier Part Number 1: NSR0320MW2T1GOSCT-ND
footprint DIO_SOD2512X110N (SC-76, SOD-323)
pins: 1 K, 2 A
